# Altium footprint library Conectores GAM.PcbLib: 182 footprints (part 9 of 12)
Each footprint in its own frame and in the unit in brackets; x right, y up, seen from the top. Pads: shape width x height; smd on the part's side, far side on the other; paste and mask are expansions set on the pad; w line width, h text height; cw(c..) or ccw(c..) is an arc to the next point about the centre after c.
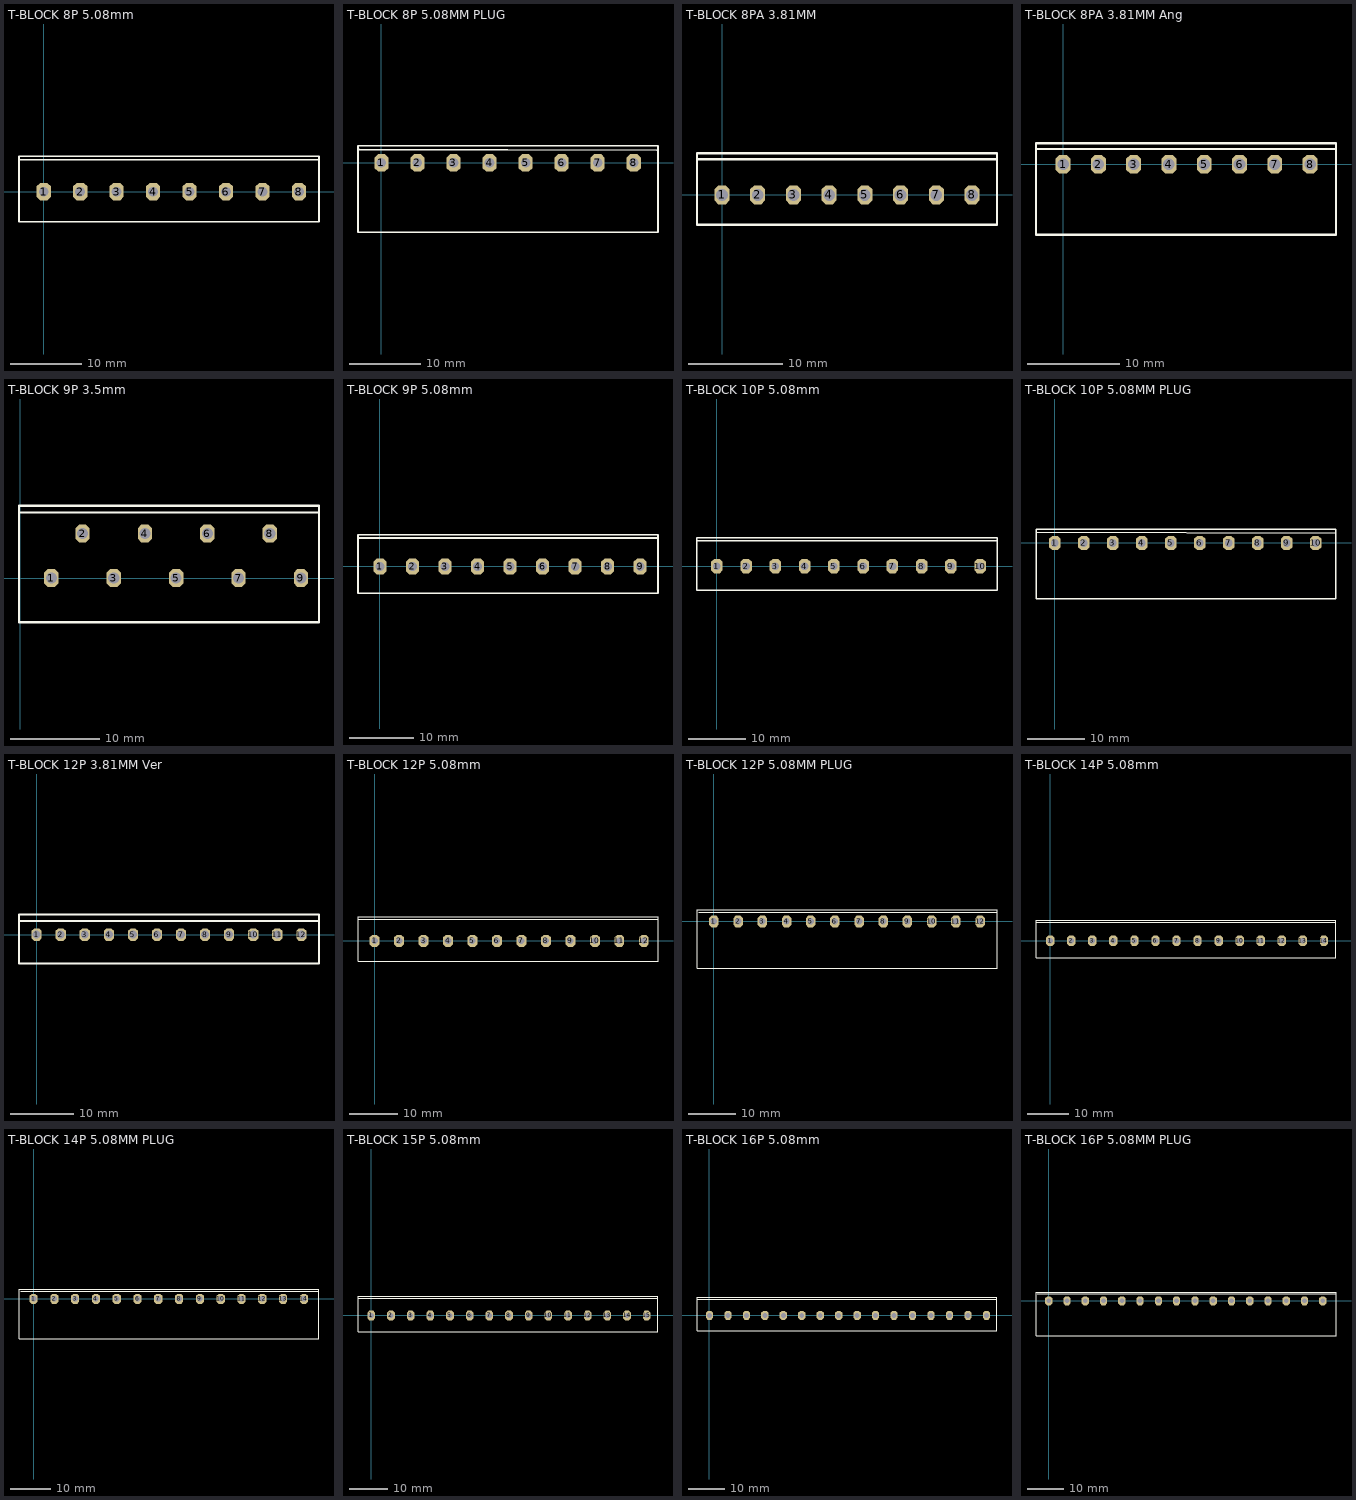
[diagram p8: the footprints below, top view; thin cyan lines are the x and y axes]

## T-BLOCK 8P 5.08mm [mm] "Terminal de Bloque 8P 5.08mm"
pads (8):
  oct 2x2.5 hole 1.35: 1(0,0) 2(5.08,0) 3(10.16,0) 4(15.24,0) 5(20.32,0) 6(25.4,0) 7(30.48,0) 8(35.56,0)
Top Overlay:
  lines w0.254: -3.302,4.445 38.354,4.445 ; -3.429,-4.191 -3.429,4.953 38.354,4.953 38.354,-4.191 -3.429,-4.191
3D body "tb1p.step": height 12.5, standoff -4.4, extent -3.14,-3.992 2.54,5.008
3D body "tb1p.step": height 12.5, standoff -4.4, extent 1.94,-3.992 7.62,5.008
3D body "tb1p.step": height 12.5, standoff -4.4, extent 7.02,-3.992 12.7,5.008
3D body "tb1p.step": height 12.5, standoff -4.4, extent 22.26,-3.992 27.94,5.008
3D body "tb1p.step": height 12.5, standoff -4.4, extent 17.18,-3.992 22.86,5.008
3D body "tb1p.step": height 12.5, standoff -4.4, extent 12.1,-3.992 17.78,5.008
3D body "tb1p.step": height 12.5, standoff -4.4, extent 27.34,-3.992 33.02,5.008
3D body "tb1p.step": height 12.5, standoff -4.4, extent 32.42,-3.992 38.1,5.008

## T-BLOCK 8P 5.08MM PLUG [mm] "Terminal de Bloque 8P 5.08mm 90"
pads (8):
  oct 2x2.5 hole 1.35: 1(0,0) 2(5.08,0) 3(10.16,0) 4(15.24,0) 5(20.32,0) 6(25.4,0) 7(30.48,0) 8(35.56,0)
Top Overlay:
  lines w0.254: -3.175,1.905 38.862,1.778 ; -3.302,-9.779 -3.302,2.413 38.989,2.413 38.989,-9.779 -3.302,-9.779
3D body "TB PlugIn 5.08mm 2PF.step": height 15.75, standoff -3.75, extent 17.06,-19.341 28.66,2.159
3D body "TB PlugIn 5.08mm 2PF.step": height 15.75, standoff -3.75, extent 6.9,-19.341 18.5,2.159
3D body: height 0.25, standoff 0, extent 0.127,2.159 0.127,2.159
3D body "TB PlugIn 5.08mm 2PF.step": height 15.75, standoff -3.75, extent -3.26,-19.341 8.34,2.159
3D body "TB PlugIn 5.08mm 2PF.step": height 15.75, standoff -3.75, extent 27.22,-19.341 38.82,2.159

## T-BLOCK 8PA 3.81MM [mm] "TERMINAL BLOCK 3.81MM 8P"
pads (8):
  oct 1.6x2 hole 1.25: 1(0,0) 2(3.81,0) 3(7.62,0) 4(11.43,0) 5(15.24,0) 6(19.05,0) 7(22.86,0) 8(26.67,0)
Top Overlay:
  lines w0.254: -2.667,3.81 29.337,3.81 ; -2.667,-3.175 29.337,-3.175 29.337,4.445 -2.667,4.445 -2.667,-3.175
3D body "Terminal Block Header - 8 Pin - ED2825-ND.step": height 9.2, standoff -3.5, extent -2.45,-2.865 29.12,4.135

## T-BLOCK 8PA 3.81MM Ang [mm] "TERMINAL BLOCK 3.81MM 8P"
pads (8):
  oct 1.6x2 hole 1.25: 1(0,0) 2(3.81,0) 3(7.62,0) 4(11.43,0) 5(15.24,0) 6(19.05,0) 7(22.86,0) 8(26.67,0)
Top Overlay:
  lines w0.254: -2.794,1.651 29.464,1.651 ; -2.921,-7.62 -2.921,2.286 29.464,2.286 29.464,-7.62 -2.921,-7.62
3D body "tb8p381b.stp": height 8.25, standoff -2.85, extent -1.905,-17.208 28.575,-1.408
3D body "tb8p381a.stp": height 7.85, standoff -2.85, extent -2.54,-8.029 29.13,1.171

## T-BLOCK 9P 3.5mm [mm] "Terminal Block 9P 3.5mm"
pads (9):
  oct 1.6x2 hole 1.25: 1(3.5,0) 2(7,5) 3(10.5,0) 4(14,5) 5(17.5,0) 6(21,5) 7(24.5,0) 8(28,5) 9(31.5,0)
Top Overlay:
  lines w0.254: -0.127,7.366 33.528,7.366 ; -0.127,-4.953 -0.127,8.128 33.528,8.128 33.528,-4.953 -0.127,-4.953
3D body "TB3.5MM-W691412120009B (rev1).stp": height 13.05, standoff -3.25, extent 0.179,-4.73 33.179,7.27

## T-BLOCK 9P 5.08mm [mm] "Terminal de Bloque 9P 5.08mm"
pads (9):
  oct 2x2.5 hole 1.35: 1(0,0) 2(5.08,0) 3(10.16,0) 4(15.24,0) 5(20.32,0) 6(25.4,0) 7(30.48,0) 8(35.56,0) 9(40.64,0)
Top Overlay:
  lines w0.254: -3.302,4.445 43.307,4.445 ; -3.429,-4.191 -3.429,4.953 43.434,4.953 43.434,-4.191 -3.429,-4.191
3D body "tb1p.step": height 12.5, standoff -4.4, extent -3.14,-3.992 2.54,5.008
3D body "tb1p.step": height 12.5, standoff -4.4, extent 1.94,-3.992 7.62,5.008
3D body "tb1p.step": height 12.5, standoff -4.4, extent 7.02,-3.992 12.7,5.008
3D body "tb1p.step": height 12.5, standoff -4.4, extent 22.26,-3.992 27.94,5.008
3D body "tb1p.step": height 12.5, standoff -4.4, extent 17.18,-3.992 22.86,5.008
3D body "tb1p.step": height 12.5, standoff -4.4, extent 12.1,-3.992 17.78,5.008
3D body "tb1p.step": height 12.5, standoff -4.4, extent 27.34,-3.992 33.02,5.008
3D body "tb1p.step": height 12.5, standoff -4.4, extent 32.42,-3.992 38.1,5.008
3D body "tb1p.step": height 12.5, standoff -4.4, extent 37.5,-3.992 43.18,5.008

## T-BLOCK 10P 5.08mm [mm] "Terminal de Bloque 10P 5.08mm"
pads (10):
  oct 2x2.5 hole 1.35: 1(0,0) 2(5.08,0) 3(10.16,0) 4(15.24,0) 5(20.32,0) 6(25.4,0) 7(30.48,0) 8(35.56,0) 9(40.64,0) 10(45.72,0)
Top Overlay:
  lines w0.254: -3.302,4.445 48.641,4.445 ; -3.429,-4.191 -3.429,4.953 48.641,4.953 48.641,-4.191 -3.429,-4.191
3D body "tb1p.step": height 12.5, standoff -4.4, extent -3.14,-3.992 2.54,5.008
3D body "tb1p.step": height 12.5, standoff -4.4, extent 1.94,-3.992 7.62,5.008
3D body "tb1p.step": height 12.5, standoff -4.4, extent 7.02,-3.992 12.7,5.008
3D body "tb1p.step": height 12.5, standoff -4.4, extent 22.26,-3.992 27.94,5.008
3D body "tb1p.step": height 12.5, standoff -4.4, extent 17.18,-3.992 22.86,5.008
3D body "tb1p.step": height 12.5, standoff -4.4, extent 12.1,-3.992 17.78,5.008
3D body "tb1p.step": height 12.5, standoff -4.4, extent 27.34,-3.992 33.02,5.008
3D body "tb1p.step": height 12.5, standoff -4.4, extent 32.42,-3.992 38.1,5.008
3D body "tb1p.step": height 12.5, standoff -4.4, extent 42.58,-3.992 48.26,5.008
3D body "tb1p.step": height 12.5, standoff -4.4, extent 37.5,-3.992 43.18,5.008

## T-BLOCK 10P 5.08MM PLUG [mm] "Terminal de Bloque 10P 5.08mm 90"
pads (10):
  oct 2x2.5 hole 1.35: 1(0,0) 2(5.08,0) 3(10.16,0) 4(15.24,0) 5(20.32,0) 6(25.4,0) 7(30.48,0) 8(35.56,0) 9(40.64,0) 10(45.72,0)
Top Overlay:
  lines w0.254: -3.175,1.905 49.276,1.747 ; -3.302,-9.779 -3.302,2.413 49.276,2.413 49.276,-9.779 -3.302,-9.779
3D body "TB PlugIn 5.08mm 2PF.step": height 15.75, standoff -3.75, extent 17.06,-19.341 28.66,2.159
3D body "TB PlugIn 5.08mm 2PF.step": height 15.75, standoff -3.75, extent 6.9,-19.341 18.5,2.159
3D body "TB PlugIn 5.08mm 2PF.step": height 15.75, standoff -3.75, extent -3.26,-19.341 8.34,2.159
3D body "TB PlugIn 5.08mm 2PF.step": height 15.75, standoff -3.75, extent 27.22,-19.341 38.82,2.159
3D body "TB PlugIn 5.08mm 2PF.step": height 15.75, standoff -3.75, extent 37.38,-19.341 48.98,2.159

## T-BLOCK 12P 3.81MM Ver [mm] "TERMINAL BLOCK 3.81MM 12P 691321300012"
pads (12):
  oct 1.6x2 hole 1.25: 1(0,0) 2(3.81,0) 3(7.62,0) 4(11.43,0) 5(15.24,0) 6(19.05,0) 7(22.86,0) 8(26.67,0) 9(30.48,0) 10(34.29,0) 11(38.1,0) 12(41.91,0)
Top Overlay:
  lines w0.254: -2.794,2.159 44.704,2.159 ; -2.794,-4.572 -2.794,3.175 44.704,3.175 44.704,-4.572 -2.794,-4.572
3D body "691321300012 (rev1).stp": height 9.6, standoff -3.1, extent -2.5,-4.335 44.41,2.865

## T-BLOCK 12P 5.08mm [mm] "Terminal de Bloque 12P 5.08mm"
pads (12):
  oct 2x2.5 hole 1.35: 1(0,0) 2(5.08,0) 3(10.16,0) 4(15.24,0) 5(20.32,0) 6(25.4,0) 7(30.48,0) 8(35.56,0) 9(40.64,0) 10(45.72,0) 11(50.8,0) 12(55.88,0)
Top Overlay:
  lines w0.254: -3.302,4.445 58.801,4.445 ; -3.429,-4.191 -3.429,4.953 58.801,4.953 58.801,-4.191 -3.429,-4.191
3D body "tb1p.step": height 12.5, standoff -4.4, extent -3.14,-3.992 2.54,5.008
3D body "tb1p.step": height 12.5, standoff -4.4, extent 1.94,-3.992 7.62,5.008
3D body "tb1p.step": height 12.5, standoff -4.4, extent 7.02,-3.992 12.7,5.008
3D body "tb1p.step": height 12.5, standoff -4.4, extent 22.26,-3.992 27.94,5.008
3D body "tb1p.step": height 12.5, standoff -4.4, extent 17.18,-3.992 22.86,5.008
3D body "tb1p.step": height 12.5, standoff -4.4, extent 12.1,-3.992 17.78,5.008
3D body "tb1p.step": height 12.5, standoff -4.4, extent 27.34,-3.992 33.02,5.008
3D body "tb1p.step": height 12.5, standoff -4.4, extent 32.42,-3.992 38.1,5.008
3D body "tb1p.step": height 12.5, standoff -4.4, extent 42.58,-3.992 48.26,5.008
3D body "tb1p.step": height 12.5, standoff -4.4, extent 37.5,-3.992 43.18,5.008
3D body "tb1p.step": height 12.5, standoff -4.4, extent 47.66,-3.992 53.34,5.008
3D body "tb1p.step": height 12.5, standoff -4.4, extent 52.74,-3.992 58.42,5.008

## T-BLOCK 12P 5.08MM PLUG [mm] "Terminal de Bloque 12P 5.08mm 90"
pads (12):
  oct 2x2.5 hole 1.35: 1(0,0) 2(5.08,0) 3(10.16,0) 4(15.24,0) 5(20.32,0) 6(25.4,0) 7(30.48,0) 8(35.56,0) 9(40.64,0) 10(45.72,0) 11(50.8,0) 12(55.88,0)
Top Overlay:
  lines w0.254: -3.175,1.905 59.436,1.905 ; -3.556,-9.779 59.436,-9.779 59.436,2.413 -3.556,2.413 -3.556,-9.779
3D body "TB PlugIn 5.08mm 2PF.step": height 15.75, standoff -3.75, extent 47.54,-19.341 59.14,2.159
3D body "TB PlugIn 5.08mm 2PF.step": height 15.75, standoff -3.75, extent 37.38,-19.341 48.98,2.159
3D body "TB PlugIn 5.08mm 2PF.step": height 15.75, standoff -3.75, extent 27.22,-19.341 38.82,2.159
3D body "TB PlugIn 5.08mm 2PF.step": height 15.75, standoff -3.75, extent -3.26,-19.341 8.34,2.159
3D body "TB PlugIn 5.08mm 2PF.step": height 15.75, standoff -3.75, extent 6.9,-19.341 18.5,2.159
3D body "TB PlugIn 5.08mm 2PF.step": height 15.75, standoff -3.75, extent 17.06,-19.341 28.66,2.159

## T-BLOCK 14P 5.08mm [mm] "Terminal de Bloque 14P 5.08mm"
pads (14):
  oct 2x2.5 hole 1.35: 1(0,0) 2(5.08,0) 3(10.16,0) 4(15.24,0) 5(20.32,0) 6(25.4,0) 7(30.48,0) 8(35.56,0) 9(40.64,0) 10(45.72,0) 11(50.8,0) 12(55.88,0) 13(60.96,0) 14(66.04,0)
Top Overlay:
  lines w0.254: -3.302,4.445 68.961,4.445 ; -3.429,-4.191 -3.429,4.953 68.961,4.953 68.961,-4.191 -3.429,-4.191
3D body "tb1p.step": height 12.5, standoff -4.4, extent 62.9,-3.992 68.58,5.008
3D body "tb1p.step": height 12.5, standoff -4.4, extent 57.82,-3.992 63.5,5.008
3D body "tb1p.step": height 12.5, standoff -4.4, extent -3.14,-3.992 2.54,5.008
3D body "tb1p.step": height 12.5, standoff -4.4, extent 1.94,-3.992 7.62,5.008
3D body "tb1p.step": height 12.5, standoff -4.4, extent 7.02,-3.992 12.7,5.008
3D body "tb1p.step": height 12.5, standoff -4.4, extent 22.26,-3.992 27.94,5.008
3D body "tb1p.step": height 12.5, standoff -4.4, extent 17.18,-3.992 22.86,5.008
3D body "tb1p.step": height 12.5, standoff -4.4, extent 12.1,-3.992 17.78,5.008
3D body "tb1p.step": height 12.5, standoff -4.4, extent 27.34,-3.992 33.02,5.008
3D body "tb1p.step": height 12.5, standoff -4.4, extent 32.42,-3.992 38.1,5.008
3D body "tb1p.step": height 12.5, standoff -4.4, extent 42.58,-3.992 48.26,5.008
3D body "tb1p.step": height 12.5, standoff -4.4, extent 37.5,-3.992 43.18,5.008
3D body "tb1p.step": height 12.5, standoff -4.4, extent 47.66,-3.992 53.34,5.008
3D body "tb1p.step": height 12.5, standoff -4.4, extent 52.74,-3.992 58.42,5.008

## T-BLOCK 14P 5.08MM PLUG [mm] "Terminal de Bloque 14P 5.08mm 90"
pads (14):
  oct 2x2.5 hole 1.35: 1(0,0) 2(5.08,0) 3(10.16,0) 4(15.24,0) 5(20.32,0) 6(25.4,0) 7(30.48,0) 8(35.56,0) 9(40.64,0) 10(45.72,0) 11(50.8,0) 12(55.88,0) 13(60.96,0) 14(66.04,0)
Top Overlay:
  lines w0.254: -3.175,1.905 69.723,1.905 ; -3.556,-9.779 69.723,-9.779 69.723,2.413 -3.556,2.413 -3.556,-9.779
3D body "TB PlugIn 5.08mm 2PF.step": height 15.75, standoff -3.75, extent 47.54,-19.341 59.14,2.159
3D body "TB PlugIn 5.08mm 2PF.step": height 15.75, standoff -3.75, extent 37.38,-19.341 48.98,2.159
3D body "TB PlugIn 5.08mm 2PF.step": height 15.75, standoff -3.75, extent 27.22,-19.341 38.82,2.159
3D body "TB PlugIn 5.08mm 2PF.step": height 15.75, standoff -3.75, extent -3.26,-19.341 8.34,2.159
3D body "TB PlugIn 5.08mm 2PF.step": height 15.75, standoff -3.75, extent 6.9,-19.341 18.5,2.159
3D body "TB PlugIn 5.08mm 2PF.step": height 15.75, standoff -3.75, extent 17.06,-19.341 28.66,2.159
3D body "TB PlugIn 5.08mm 2PF.step": height 15.75, standoff -3.75, extent 57.7,-19.341 69.3,2.159

## T-BLOCK 15P 5.08mm [mm] "Terminal de Bloque 15P 5.08mm"
pads (15):
  oct 2x2.5 hole 1.35: 1(0,0) 2(5.08,0) 3(10.16,0) 4(15.24,0) 5(20.32,0) 6(25.4,0) 7(30.48,0) 8(35.56,0) 9(40.64,0) 10(45.72,0) 11(50.8,0) 12(55.88,0) 13(60.96,0) 14(66.04,0) 15(71.12,0)
Top Overlay:
  lines w0.254: -3.302,4.445 74.041,4.445 ; -3.429,-4.191 -3.429,4.953 74.041,4.953 74.041,-4.191 -3.429,-4.191
3D body "tb1p.step": height 12.5, standoff -4.4, extent 62.9,-3.992 68.58,5.008
3D body "tb1p.step": height 12.5, standoff -4.4, extent 57.82,-3.992 63.5,5.008
3D body "tb1p.step": height 12.5, standoff -4.4, extent -3.14,-3.992 2.54,5.008
3D body "tb1p.step": height 12.5, standoff -4.4, extent 1.94,-3.992 7.62,5.008
3D body "tb1p.step": height 12.5, standoff -4.4, extent 7.02,-3.992 12.7,5.008
3D body "tb1p.step": height 12.5, standoff -4.4, extent 22.26,-3.992 27.94,5.008
3D body "tb1p.step": height 12.5, standoff -4.4, extent 17.18,-3.992 22.86,5.008
3D body "tb1p.step": height 12.5, standoff -4.4, extent 12.1,-3.992 17.78,5.008
3D body "tb1p.step": height 12.5, standoff -4.4, extent 27.34,-3.992 33.02,5.008
3D body "tb1p.step": height 12.5, standoff -4.4, extent 32.42,-3.992 38.1,5.008
3D body "tb1p.step": height 12.5, standoff -4.4, extent 42.58,-3.992 48.26,5.008
3D body "tb1p.step": height 12.5, standoff -4.4, extent 37.5,-3.992 43.18,5.008
3D body "tb1p.step": height 12.5, standoff -4.4, extent 47.66,-3.992 53.34,5.008
3D body "tb1p.step": height 12.5, standoff -4.4, extent 52.74,-3.992 58.42,5.008
3D body "tb1p.step": height 12.5, standoff -4.4, extent 67.98,-3.992 73.66,5.008

## T-BLOCK 16P 5.08mm [mm] "Terminal de Bloque 16P 5.08mm"
pads (16):
  oct 2x2.5 hole 1.35: 1(0,0) 2(5.08,0) 3(10.16,0) 4(15.24,0) 5(20.32,0) 6(25.4,0) 7(30.48,0) 8(35.56,0) 9(40.64,0) 10(45.72,0) 11(50.8,0) 12(55.88,0) 13(60.96,0) 14(66.04,0) 15(71.12,0) 16(76.2,0)
Top Overlay:
  lines w0.254: -3.302,4.445 79.121,4.445 ; -3.429,-4.191 79.121,-4.191 79.121,4.953 -3.429,4.953 -3.429,-4.191
3D body "tb1p.step": height 12.5, standoff -4.4, extent 73.06,-3.992 78.74,5.008
3D body "tb1p.step": height 12.5, standoff -4.4, extent 67.98,-3.992 73.66,5.008
3D body "tb1p.step": height 12.5, standoff -4.4, extent 52.74,-3.992 58.42,5.008
3D body "tb1p.step": height 12.5, standoff -4.4, extent 47.66,-3.992 53.34,5.008
3D body "tb1p.step": height 12.5, standoff -4.4, extent 37.5,-3.992 43.18,5.008
3D body "tb1p.step": height 12.5, standoff -4.4, extent 42.58,-3.992 48.26,5.008
3D body "tb1p.step": height 12.5, standoff -4.4, extent 32.42,-3.992 38.1,5.008
3D body "tb1p.step": height 12.5, standoff -4.4, extent 27.34,-3.992 33.02,5.008
3D body "tb1p.step": height 12.5, standoff -4.4, extent 12.1,-3.992 17.78,5.008
3D body "tb1p.step": height 12.5, standoff -4.4, extent 17.18,-3.992 22.86,5.008
3D body "tb1p.step": height 12.5, standoff -4.4, extent 22.26,-3.992 27.94,5.008
3D body "tb1p.step": height 12.5, standoff -4.4, extent 7.02,-3.992 12.7,5.008
3D body "tb1p.step": height 12.5, standoff -4.4, extent 1.94,-3.992 7.62,5.008
3D body "tb1p.step": height 12.5, standoff -4.4, extent -3.14,-3.992 2.54,5.008
3D body "tb1p.step": height 12.5, standoff -4.4, extent 57.82,-3.992 63.5,5.008
3D body "tb1p.step": height 12.5, standoff -4.4, extent 62.9,-3.992 68.58,5.008

## T-BLOCK 16P 5.08MM PLUG [mm] "Terminal de Bloque 16P 5.08mm 90"
pads (16):
  oct 2x2.5 hole 1.35: 1(0,0) 2(5.08,0) 3(10.16,0) 4(15.24,0) 5(20.32,0) 6(25.4,0) 7(30.48,0) 8(35.56,0) 9(40.64,0) 10(45.72,0) 11(50.8,0) 12(55.88,0) 13(60.96,0) 14(66.04,0) 15(71.12,0) 16(76.2,0)
Top Overlay:
  lines w0.254: -3.175,1.905 79.883,1.905 ; -3.556,-9.779 -3.556,2.413 79.883,2.413 79.883,-9.779 -3.556,-9.779
3D body "TB PlugIn 5.08mm 2PF.step": height 15.75, standoff -3.75, extent 57.7,-19.341 69.3,2.159
3D body "TB PlugIn 5.08mm 2PF.step": height 15.75, standoff -3.75, extent 17.06,-19.341 28.66,2.159
3D body "TB PlugIn 5.08mm 2PF.step": height 15.75, standoff -3.75, extent 6.9,-19.341 18.5,2.159
3D body "TB PlugIn 5.08mm 2PF.step": height 15.75, standoff -3.75, extent -3.26,-19.341 8.34,2.159
3D body "TB PlugIn 5.08mm 2PF.step": height 15.75, standoff -3.75, extent 27.22,-19.341 38.82,2.159
3D body "TB PlugIn 5.08mm 2PF.step": height 15.75, standoff -3.75, extent 37.38,-19.341 48.98,2.159
3D body "TB PlugIn 5.08mm 2PF.step": height 15.75, standoff -3.75, extent 47.54,-19.341 59.14,2.159
3D body "TB PlugIn 5.08mm 2PF.step": height 15.75, standoff -3.75, extent 67.86,-19.341 79.46,2.159